# Altium footprint library mastermind.PCBLIB: 1061 footprints (part 18 of 67)
Each footprint in its own frame and in the unit in brackets; x right, y up, seen from the top. Pads: shape width x height; smd on the part's side, far side on the other; paste and mask are expansions set on the pad; w line width, h text height; cw(c..) or ccw(c..) is an arc to the next point about the centre after c.
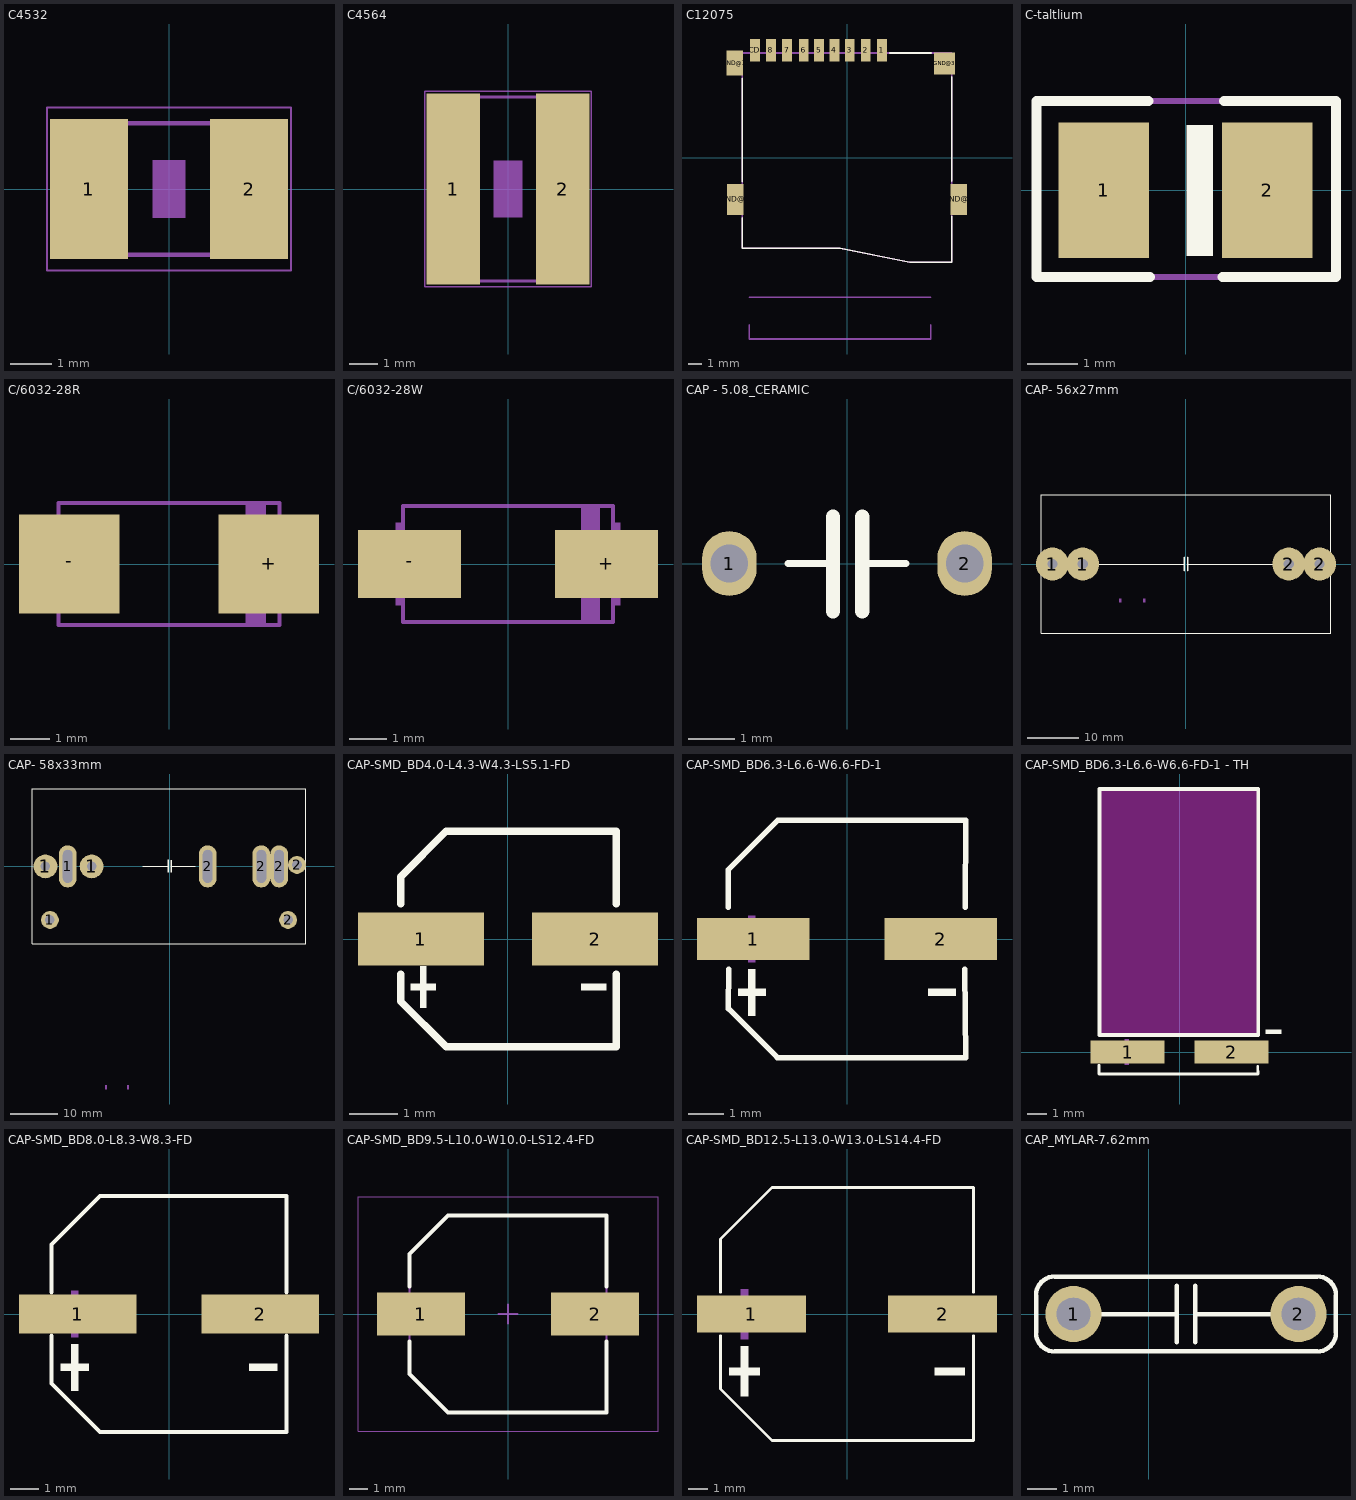
[diagram p17: the footprints below, top view; thin cyan lines are the x and y axes]

## C4532 [mm]
pads (2):
  rect 1.9x3.4 smd: 1(-1.95,0) 2(1.95,0)
Mechanical 8:
  region: 1.448,-1.651 1.448,1.649 2.398,1.649 2.398,-1.651
  region: -2.388,-1.651 -2.388,1.649 -1.438,1.649 -1.438,-1.651
  lines w0.102: -1.473,1.6 1.473,1.6 ; -1.448,-1.6 1.473,-1.6
Mechanical 30:
  region: -0.4,-0.7 -0.4,0.7 0.4,0.7 0.4,-0.7
Mechanical 29 (Mech34):
  lines w0.051: -2.973,-1.983 -2.973,1.983 2.973,1.983 2.973,-1.983 -2.973,-1.983

## C4564 [mm]
pads (2):
  rect 1.9x6.8 smd: 1(-1.95,0) 2(1.95,0)
Mechanical 8:
  region: -2.413,-3.353 -2.413,3.347 -1.463,3.347 -1.463,-3.353
  region: 1.448,-3.353 1.448,3.347 2.398,3.347 2.398,-3.353
  lines w0.102: -1.499,3.277 1.473,3.277 ; -1.473,-3.277 1.499,-3.277
Mechanical 30:
  region: -0.5,-1 -0.5,1 0.5,1 0.5,-1
Mechanical 29 (Mech34):
  lines w0.051: -2.973,-3.483 2.973,-3.483 2.973,3.483 -2.973,3.483 -2.973,-3.483

## C12075 [mm]
pads (13):
  rect 0.7x1.6 smd: 1(2.5,7.7) 2(1.35,7.7) 3(0.2,7.7) 4(-0.9,7.7) 5(-2,7.7) 6(-3.1,7.7) 7(-4.3,7.7) 8(-5.45,7.7) CD(-6.6,7.7)
  rect 1.2x1.8 smd: GND@1(-8.05,6.77)
  rect 1.2x2.2 smd: GND@2(-8,-3) GND@4(8,-3)
  rect 1.5x1.6 smd: GND@3(6.99,6.75)
Top Overlay:
  lines w0.127: -7.5,-4.308 -7.5,-6.5 -0.5,-6.5 4.5,-7.5 7.5,-7.5 7.5,-4.2 ; -7.5,-1.721 -7.5,5.682 ; 3.06,7.5 6.037,7.5 ; 7.5,-1.694 7.5,5.768
Dimensions:
  lines w0.127: -7,-12 -7,-13 6,-13 6,-12 ; -7,-10 6,-10 ; -7.5,-6.5 -0.5,-6.5 4.5,-7.5 7.5,-7.5 7.5,7.5 -7.5,7.5 -7.5,-6.5

## C-taltlium [mm]
pads (2):
  rect 1.8x2.7 smd: 1(-1.629,0) 2(1.629,0)
Top Overlay:
  region: 0.025,-1.3 0.025,1.3 0.547,1.3 0.547,-1.3
  lines w0.2: -0.737,1.778 -2.972,1.778 -2.972,-1.727 -0.711,-1.727 ; 0.737,-1.727 2.997,-1.727 2.997,1.778 0.762,1.778
Mechanical 29:
  lines w0.127: -2.972,-1.727 2.997,-1.727 2.997,1.778 -2.972,1.778 -2.972,-1.727
  text ".Comment" at -2.502,-0.406 h1.5

## C/6032-28R [mm]
pads (2):
  rect 2.55x2.5 smd: +(2.525,0) -(-2.525,0)
Mechanical 8:
  region: 1.95,-1.575 1.95,1.575 2.45,1.575 2.45,-1.575
  region: 2.85,-1.1 2.85,1.1 3,1.1 3,-1.1
  region: -3,-1.1 -3,1.1 -2.85,1.1 -2.85,-1.1
  lines w0.102: -2.8,-1.55 -2.8,1.55 2.8,1.55 2.8,-1.55 -2.8,-1.55

## C/6032-28W [mm]
pads (2):
  rect 2.75x1.8 smd: +(2.625,0) -(-2.625,0)
Mechanical 8:
  region: 1.95,-1.575 1.95,1.575 2.45,1.575 2.45,-1.575
  region: 2.85,-1.1 2.85,1.1 3,1.1 3,-1.1
  region: -3,-1.1 -3,1.1 -2.85,1.1 -2.85,-1.1
  lines w0.102: -2.8,-1.55 -2.8,1.55 2.8,1.55 2.8,-1.55 -2.8,-1.55

## CAP - 5.08_CERAMIC [mm]
pads (2):
  oval 1.18x1.4 hole 0.813: 1(-2.54,0) 2(2.54,0)
Top Overlay:
  lines w0.152: -1.27,0 -0.305,0 ; 0.33,0 1.27,0
  lines w0.305: -0.305,-1.03 -0.305,0 -0.305,1.01 ; 0.33,-1.03 0.33,0 0.33,1.01
Mechanical 8:
  region: -2.54,-0.381 -2.54,0.381 -2.159,0.381 -2.159,-0.381
  region: 2.159,-0.381 2.159,0.381 2.54,0.381 2.54,-0.381
3D body "Ceramic Cap, 5mm lead spacing, 4mm width, and 5.5mm tall, v4 v2.step": height 5.4, standoff -1.9, extent -2.825,-1.3 2.825,1.154

## CAP- 56x27mm [mm]
pads (4):
  round 6.4 hole 2: 1(-26,0) 1(-20.1,0) 2(20,0) 2(26,0)
Top Overlay:
  lines w0.127: -28.135,-13.5 -28.135,13.5 28.165,13.5 28.165,-13.5 -28.135,-13.5
  lines w0.152: -22.9,0 -0.3,0 ; 0.335,0 23.1,0
  lines w0.305: -0.3,-1.27 -0.3,0 -0.3,1.321 ; 0.335,-1.27 0.335,0 0.335,1.295
Mechanical 2:
  text "String" at -12.921,3.062 h1.52
Mechanical 8:
  region: -13.015,-7.481 -13.015,-6.719 -12.634,-6.719 -12.634,-7.481
  region: -8.316,-7.481 -8.316,-6.719 -7.935,-6.719 -7.935,-7.481
3D body "5Kw INVI 10uF400V.STEP": height 37.5, standoff -7.5, extent -28.5,-15.164 28.5,14.836

## CAP- 58x33mm [mil]
pads (9):
  round 200 hole 80: 1(-1042.63,-2.01) 1(-655.13,-2.01)
  round 150 hole 80: 1(-1005.13,-452.01) 2(994.87,-452.01) 2(1069.87,10.49)
  oval 150x354.33 hole 80 slot 275.59 at 90 deg: 1(-855.63,-2.01) 2(319.87,-2.01) 2(769.87,-2.01) 2(919.87,-2.01)
Top Overlay:
  lines w6: -225.7,-0.16 -9.34,-0.16 ; 15.66,-0.16 217.21,-0.16
  lines w10: -1155.13,-652.01 1144.87,-652.01 1144.87,647.99 -1155.13,647.99 -1155.13,-652.01
  lines w12: -9.34,-50.16 -9.34,-0.16 -9.34,51.84 ; 15.66,-50.16 15.66,-0.16 15.66,50.84
Mechanical 2:
  text "String" at -574.42,-363.71 h60
Mechanical 8:
  region: -542.24,-1871.5 -542.24,-1841.5 -527.24,-1841.5 -527.24,-1871.5
  region: -357.24,-1871.5 -357.24,-1841.5 -342.24,-1841.5 -342.24,-1871.5
3D body: height 1377.95, standoff 0, extent -1161.42,-652.01 1144.87,649.61

## CAP-SMD_BD4.0-L4.3-W4.3-LS5.1-FD [mm]
pads (2):
  rect 2.6x1.1 smd: 1(-1.8,0) 2(1.8,0)
Top Overlay:
  region: 2.031,-0.925 2.031,-1.054 1.515,-1.054 1.515,-0.925
  region: -2.011,-0.925 -2.011,-1.054 -1.495,-1.054 -1.495,-0.925
  region: -1.818,-0.559 -1.818,-1.419 -1.689,-1.419 -1.689,-0.559
  lines w0.152: -2.217,-0.73 -2.217,-1.29 -2.217,-1.29 -1.28,-2.225 2.236,-2.225 2.236,-0.73 ; -2.217,0.73 -2.217,1.29 -1.28,2.226 2.236,2.226 2.236,0.73
Mechanical 15:
  region: 2.031,0.064 2.031,-0.065 1.515,-0.065 1.515,0.064
  region: -2.011,0.064 -2.011,-0.065 -1.495,-0.065 -1.495,0.064
  region: -1.818,0.43 -1.818,-0.43 -1.689,-0.43 -1.689,0.43
3D body "CAPAE430X550N-(B).stp": height 5.8, standoff 0, extent -2.326,-2.053 2.674,2.247

## CAP-SMD_BD6.3-L6.6-W6.6-FD-1 [mm]
pads (2):
  rect 3.2x1.2 smd: 1(-2.67,0) 2(2.67,0)
Top Overlay:
  region: -2.805,-0.858 -2.805,-2.178 -2.607,-2.178 -2.607,-0.858
  region: -3.102,-1.419 -3.102,-1.617 -2.31,-1.617 -2.31,-1.419
  region: 3.102,-1.419 3.102,-1.617 2.31,-1.617 2.31,-1.419
  lines w0.152: -3.376,0.9 -3.376,1.98 -1.98,3.376 3.376,3.376 3.37,0.9 ; -3.364,-0.858 -3.376,-1.981 -1.981,-3.376 3.376,-3.376 3.357,-0.858
Mechanical 15:
  region: -2.805,0.66 -2.805,-0.66 -2.607,-0.66 -2.607,0.66
  region: -3.102,0.099 -3.102,-0.099 -2.31,-0.099 -2.31,0.099
  region: 3.102,0.099 3.102,-0.099 2.31,-0.099 2.31,0.099
3D body "CAPAE-D6.3x5.4.stp": height 5.5, standoff 0, extent -3.87,-3.37 3.93,3.43

## CAP-SMD_BD6.3-L6.6-W6.6-FD-1 - TH [mm]
pads (2):
  rect 3.8x1.2 smd: 1(-2.67,0) 2(2.67,0)
Top Overlay:
  region: 5.236,1.15 5.236,0.952 4.444,0.952 4.444,1.15
  lines w0.152: -4.133,-0.678 -4.137,-1.14 4.026,-1.14 4.023,-0.734
  lines w0.2: -4.109,0.878 4.051,0.878 4.051,13.528 -4.109,13.528 -4.109,0.878
Keep-Out Layer:
  region: -4.109,13.528 4.051,13.528 4.051,0.878 -4.109,0.878
Mechanical 15:
  region: -2.805,0.66 -2.805,-0.66 -2.607,-0.66 -2.607,0.66
  region: -3.102,0.099 -3.102,-0.099 -2.31,-0.099 -2.31,0.099
  region: 3.102,0.099 3.102,-0.099 2.31,-0.099 2.31,0.099

## CAP-SMD_BD8.0-L8.3-W8.3-FD [mm]
pads (2):
  rect 4.2x1.4 smd: 1(-3.267,0) 2(3.267,0)
Top Overlay:
  region: -3.503,-1.079 -3.503,-2.739 -3.254,-2.739 -3.254,-1.079
  region: -3.876,-1.785 -3.876,-2.033 -2.88,-2.033 -2.88,-1.785
  region: 3.876,-1.785 3.876,-2.033 2.88,-2.033 2.88,-1.785
  lines w0.152: -4.201,-0.782 -4.201,-2.49 -2.465,-4.226 4.201,-4.226 4.201,-0.782 ; -4.201,0.782 -4.201,2.49 -2.465,4.226 4.201,4.226 4.201,0.782
Mechanical 15:
  region: -3.503,0.83 -3.503,-0.83 -3.254,-0.83 -3.254,0.83
  region: -3.876,0.125 -3.876,-0.125 -2.88,-0.125 -2.88,0.125
  region: 3.876,0.125 3.876,-0.125 2.88,-0.125 2.88,0.125
3D body "220uF 50V.STEP": height 10.51, standoff 0, extent -4.624,-4.074 4.876,4.226

## CAP-SMD_BD9.5-L10.0-W10.0-LS12.4-FD [mm]
pads (2):
  rect 4.7x2.3 smd: 1(-4.65,0) 2(4.65,0)
Top Overlay:
  lines w0.2: -5.25,-1.45 -5.25,-3.2 -3.2,-5.25 5.25,-5.25 5.25,-1.45 ; -5.25,1.45 -5.25,3.2 -3.2,5.25 5.25,5.25 5.25,1.45
Mechanical 13:
  lines w0.1: -5.25,-3.2 -3.2,-5.25 5.25,-5.25 5.25,5.25 -3.2,5.25 -5.25,3.2 -5.25,-3.2
Mechanical 15:
  lines w0.05: -8,-6.25 -8,6.25 8,6.25 8,-6.25 -8,-6.25
  lines w0.1: -0.5,0 0.5,0 ; 0,-0.5 0,0.5
Mechanical 22:
  text "LEAD SPACING" at -9.046,6.754 h1.52
  text "BODY DIA" at -5.146,-8.546 h1.52
3D body "CAPAE118103X105M.step": height 10.5, standoff 0, extent -5.9,-5.25 5.9,5.25

## CAP-SMD_BD12.5-L13.0-W13.0-LS14.4-FD [mm]
pads (2):
  rect 5.66x1.9 smd: 1(-4.97,0) 2(4.97,0)
Top Overlay:
  region: -6.11,-3.185 -4.55,-3.185 -4.55,-2.795 -6.11,-2.795
  region: 4.55,-3.185 6.11,-3.185 6.11,-2.795 4.55,-2.795
  region: -5.525,-4.29 -5.135,-4.29 -5.135,-1.69 -5.525,-1.69
  lines w0.152: -6.576,-1.13 -6.576,-3.9 -3.9,-6.576 6.576,-6.576 6.576,-1.13 ; -6.576,1.13 -6.576,3.9 -3.9,6.576 6.576,6.576 6.576,1.13
Mechanical 15:
  region: -6.11,-0.195 -4.55,-0.195 -4.55,0.195 -6.11,0.195
  region: 4.55,-0.195 6.11,-0.195 6.11,0.195 4.55,0.195
  region: -5.525,-1.3 -5.135,-1.3 -5.135,1.3 -5.525,1.3

## CAP_MYLAR-7.62mm [mil]
pads (2):
  round 75 hole 43 slot 45.15 at 0 deg paste-99999 mask+4: 1(-100,0) 2(200,0)
Top Overlay:
  lines w6: -65,0 37.5,0 ; 37.5,-37.5 37.5,0 ; 37.5,37.5 37.5,0 ; 62.5,-37.5 62.5,0 ; 62.5,37.5 62.5,0 ; 167.5,0 62.5,0 ; -150,-25 ccw(c-125,-25) -125,-50 225,-50 ccw(c225,-25) 250,-25 250,25 ccw(c225,25) 225,50 -125,50 ccw(c-125,25) -150,25 -150,-25